# Altium footprint library Footprints.PcbLib: 207 footprints (part 9 of 13)
Each footprint in its own frame and in the unit in brackets; x right, y up, seen from the top. Pads: shape width x height; smd on the part's side, far side on the other; paste and mask are expansions set on the pad; w line width, h text height; cw(c..) or ccw(c..) is an arc to the next point about the centre after c.
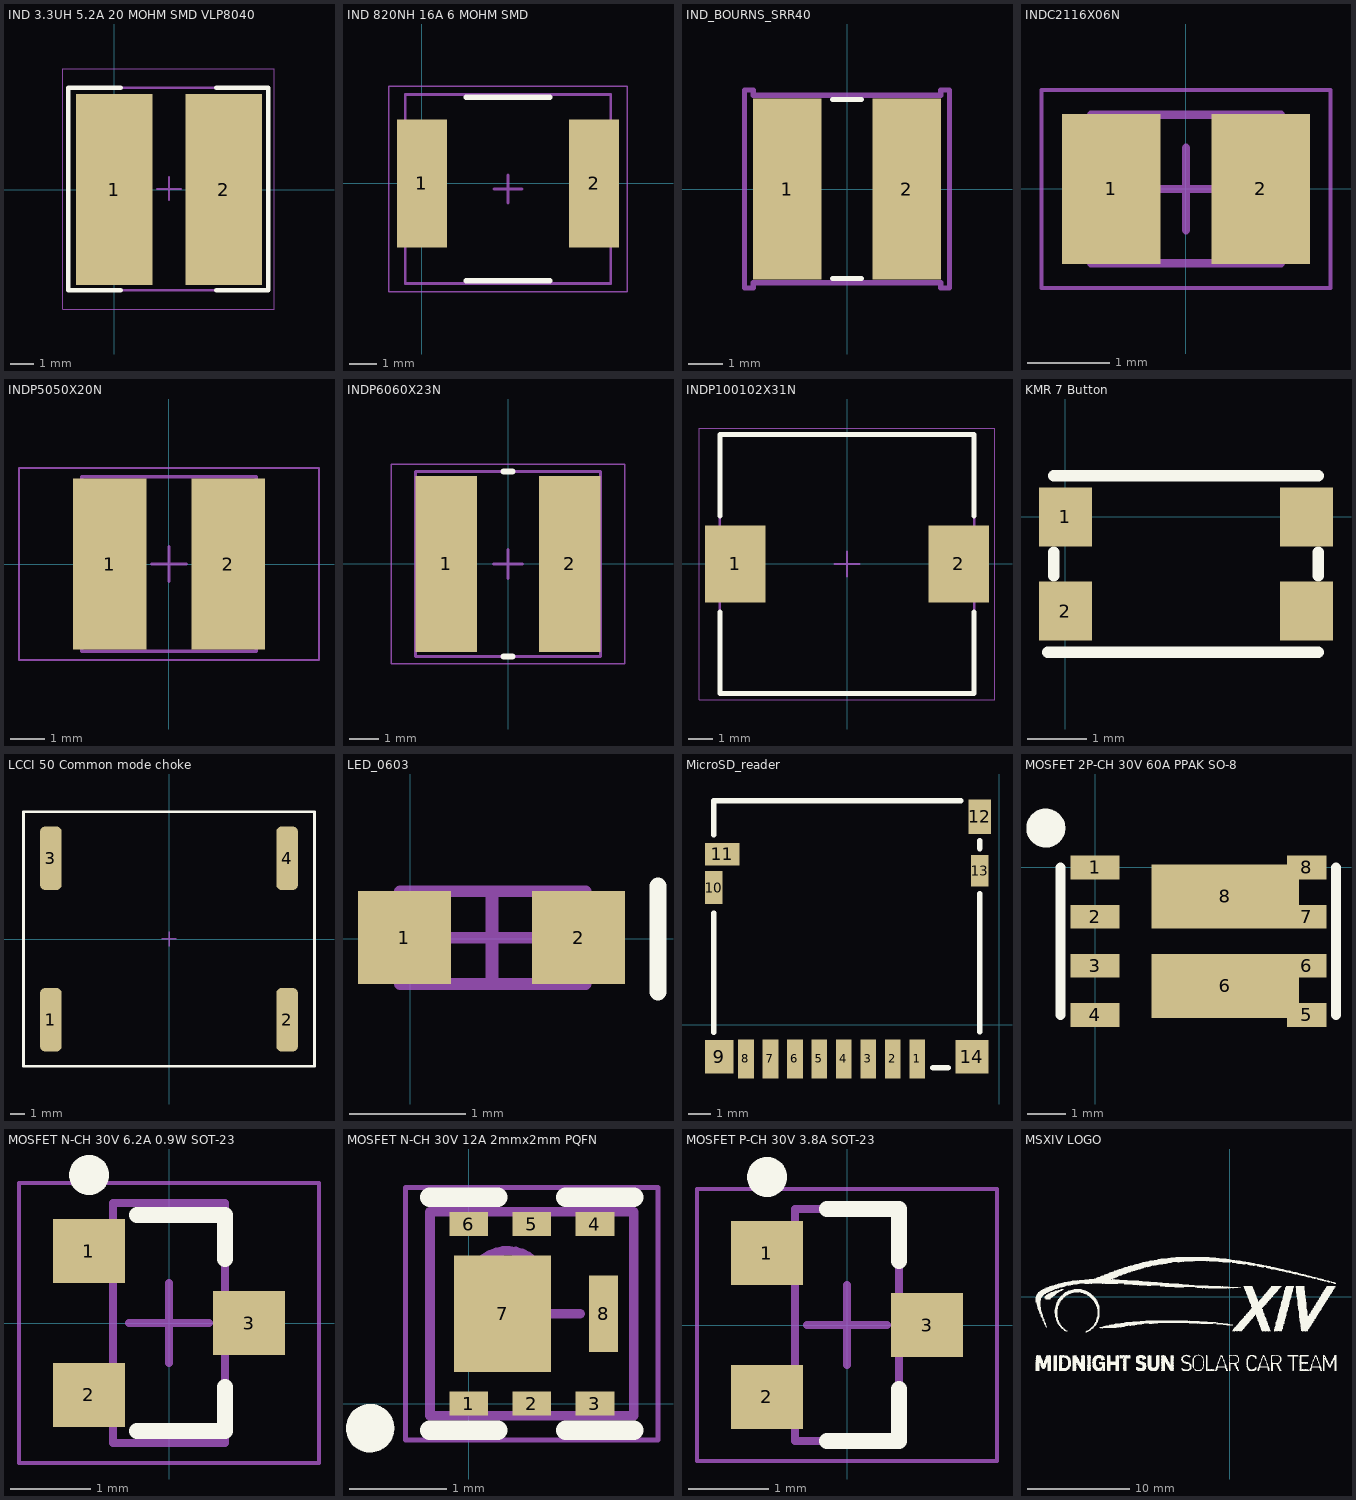
[diagram p8: the footprints below, top view; thin cyan lines are the x and y axes]

## IND 3.3UH 5.2A 20 MOHM SMD VLP8040 [mm] "IND 3.3UH 5.2A 20 MOHM SMD"
height 4
pads (2):
  rect 3.3x8.2 smd: 1(0,0) 2(4.7,0)
Top Overlay:
  lines w0.2: 0.275,-4.325 -1.975,-4.325 -1.975,4.375 0.275,4.375 ; 4.375,-4.325 6.625,-4.325 6.625,4.375 4.375,4.375
Assembly Top:
  lines w0.1: -1.975,-4.325 -1.975,4.375 6.625,4.375 6.625,-4.325 -1.975,-4.325
Courtyard Top:
  lines w0.05: -2.225,-5.15 -2.225,5.2 6.875,5.2 6.875,-5.15 -2.225,-5.15
  lines w0.1: 1.85,0.025 2.85,0.025 ; 2.35,-0.45 2.35,0.525
3D body "IND 3.3UH 5.2A 20 MOHM SMD VLP8040.step": height 4.1, standoff 0, extent -1.625,-4.675 6.975,3.925

## IND 820NH 16A 6 MOHM SMD [mm] "820nH Shielded Molded Inductor 16A 6mOhm Max Nonstandard"
pads (2):
  rect 1.8x4.6 smd: 1(0,0) 2(6.2,0)
Top Overlay:
  lines w0.2: 1.6,-3.51 4.6,-3.51 ; 1.6,3.11 4.6,3.11
Mechanical 13:
  lines w0.1: -0.6,-3.6 -0.6,3.2 6.8,3.2 6.8,-3.6 -0.6,-3.6
Mechanical 15:
  lines w0.05: -1.2,-3.9 -1.2,3.5 7.4,3.5 7.4,-3.9 -1.2,-3.9
  lines w0.1: 2.6,-0.2 3.6,-0.2 ; 3.1,-0.7 3.1,0.3
3D body: height 3, standoff 0, extent 0.9,-3.6 5.3,3.2
3D body: height 3, standoff 0, extent -0.6,-3.6 0.9,3.2
3D body: height 3, standoff 0, extent 5.3,-3.6 6.8,3.2

## IND_BOURNS_SRR40 [mil]
pads (2):
  rect 79x209 smd: 1(-69,0) 2(69,0)
Top Overlay:
  lines w6: -16.4,-103.5 16.4,-103.5 ; -16.4,103.5 16.4,103.5
Mechanical 13:
  circle w0: c-95.5,0 r3
Mechanical 15:
  lines w6: -118.5,-114.5 -108.5,-114.5 -108.5,-108.5 108.5,-108.5 108.5,-114.5 118.5,-114.5 118.5,114.5 108.5,114.5 108.5,108.5 -108.5,108.5 -108.5,114.5 -118.5,114.5 -118.5,-114.5
3D body "IND_BOURNS_SRR4018.stp": height 79, standoff 0, extent -98.5,-104.5 98.5,104.5

## INDC2116X06N [mm] "Chip Inductor, 2-Leads, Body 2.10x1.60mm, IPC Medium Density"
height 0.6
pads (2):
  rect 1.19x1.82 smd: 1(-0.905,0) 2(0.905,0)
Mechanical 13:
  lines w0.1: -1.15,-0.9 -1.15,0.9 1.15,0.9 1.15,-0.9 -1.15,-0.9
Mechanical 15:
  lines w0.05: -1.75,-1.2 -1.75,1.2 1.75,1.2 1.75,-1.2 -1.75,-1.2
  lines w0.1: -0.5,0 0.5,0 ; 0,-0.5 0,0.5
3D body "INDC2116X06N.step": height 0.6, standoff 0, extent -1.15,-0.9 1.15,0.9

## INDP5050X20N [mm] "Precision Wire Wound Inductor, 2-Leads, Body 5.00x5.00mm, IPC Medium Density"
height 2
pads (2):
  rect 2.1x4.9 smd: 1(-1.7,0) 2(1.7,0)
Mechanical 13:
  lines w0.1: -2.5,-2.5 -2.5,2.5 2.5,2.5 2.5,-2.5 -2.5,-2.5
Mechanical 15:
  lines w0.05: -4.3,-2.75 -4.3,2.75 4.3,2.75 4.3,-2.75 -4.3,-2.75
  lines w0.1: -0.5,0 0.5,0 ; 0,-0.5 0,0.5
3D body "INDP5050X20N.step": height 2.1, standoff 0, extent -2.6,-2.5 2.6,2.5

## INDP6060X23N [mm] "Precision Wire Wound Inductor, 2-Leads, Body 6.00x6.00mm, IPC Medium Density"
height 2.29
pads (2):
  rect 2.1x6 smd: 1(-2.1,0) 2(2.1,0)
Top Overlay:
  lines w0.2: -0.15,-3.15 0.15,-3.15 ; -0.15,3.15 0.15,3.15
Mechanical 13:
  lines w0.1: -3.15,-3.15 3.15,-3.15 3.15,3.15 -3.15,3.15 -3.15,-3.15
Mechanical 15:
  lines w0.05: -3.975,-3.4 3.975,-3.4 3.975,3.4 -3.975,3.4 -3.975,-3.4
  lines w0.1: -0.5,0 0.5,0 ; 0,-0.5 0,0.5
3D body "INDP6060X23N.step": height 2.39, standoff 0, extent -3.1,-3 3.1,3

## INDP100102X31N [mm] "Precision Wire Wound Inductor, 2-Leads, Body 10.00x10.20mm, IPC Medium Density"
height 3.1
pads (2):
  rect 2.45x3.1 smd: 1(-4.525,0) 2(4.525,0)
Top Overlay:
  lines w0.2: -5.15,-1.95 -5.15,-5.25 5.15,-5.25 5.15,-1.95 ; -5.15,1.95 -5.15,5.25 5.15,5.25 5.15,1.95
Mechanical 13:
  lines w0.1: -5.15,-5.25 5.15,-5.25 5.15,5.25 -5.15,5.25 -5.15,-5.25
Mechanical 15:
  lines w0.05: -5.975,-5.5 5.975,-5.5 5.975,5.5 -5.975,5.5 -5.975,-5.5
  lines w0.1: -0.5,0 0.5,0 ; 0,-0.5 0,0.5
3D body: height 3.1, standoff 0, extent -5.15,-5.25 5.15,5.25

## KMR 7 Button [mm]
pads (4):
  rect 0.9x1 smd: 1(0,0) 2(0,-1.6) ""(4.1,-1.6) ""(4.1,0)
Top Overlay:
  lines w0.2: -0.3,-2.3 4.3,-2.3 ; -0.2,-1 -0.2,-0.6 ; -0.2,0.7 4.3,0.7 ; 4.3,-1 4.3,-0.6

## LCCI 50 Common mode choke [mil] "5.6A CMC 18mm x20mm x 10mm"
height 51.18
pads (4):
  rrect50% 60x175 smd: 1(-325,-222) 2(325,-222) 3(-325,222) 4(325,222)
Top Overlay:
  lines w7.87: -400,-350 -400,350 400,350 400,-350 -400,-350
Mechanical 13:
  lines w3.94: -400,-350 400,-350 400,350 -400,350 -400,-350
Mechanical 15:
  lines w3.94: -19.68,0 19.68,0 ; 0,-19.68 0,19.69
3D body: height 390, standoff 0, extent -400,-350 400,350

## LED_0603 [mm]
pads (2):
  rect 0.8x0.8 smd: 1(-0.05,0.01) 2(1.45,0.01)
Top Overlay:
  lines w0.15: 2.134,-0.457 2.134,0.453
Mechanical 13:
  rectangle: 1.296,-0.39 1.511,0.41
  lines w0.1: -0.089,-0.39 -0.089,0.41 1.511,0.41 1.511,-0.39 -0.089,-0.39
Mechanical 15:
  lines w0.1: 0.3,0.01 1.1,0.01 ; 0.311,0.01 1.111,0.01 ; 0.7,-0.39 0.7,0.41 ; 0.711,-0.39 0.711,0.41
3D body: height 0.8, standoff 0.3, extent 0.203,-0.295 1.219,0.315
3D body: height 0.3, standoff 0, extent -0.089,-0.39 1.511,0.41

## MicroSD_reader [mm]
pads (14):
  rect 0.7x1.75 smd: 1(-3.686,-1.534) 2(-4.786,-1.534) 3(-5.886,-1.534) 4(-6.986,-1.534) 5(-8.086,-1.534) 6(-9.186,-1.534) 7(-10.286,-1.534) 8(-11.386,-1.534)
  rect 1.3x1.5 smd: 9(-12.586,-1.434)
  rect 0.8x1.5 smd: 10(-12.836,6.166)
  rect 1.55x1 smd: 11(-12.461,7.666)
  rect 1x1.55 smd: 12(-0.886,9.341)
  rect 0.8x1.4 smd: 13(-0.886,6.916)
  rect 1.5x1.5 smd: 14(-1.236,-1.434)
Top Overlay:
  lines w0.254: -12.836,-0.334 -12.836,5.016 ; -12.836,8.541 -12.836,10.066 -5.111,10.066 -1.736,10.066 ; -2.986,-1.934 -2.311,-1.934 ; -0.886,-0.309 -0.886,5.891 ; -0.886,7.916 -0.886,8.266 ; -12.836,5.016 -12.836,5.016 ; -12.836,5.016 -12.836,5.016

## MOSFET 2P-CH 30V 60A PPAK SO-8 [mm] "Mosfet Array 2 P-Channel (Dual) 30V 60A 46W Surface Mount PowerPAK® SO-8 Dual"
height 1.12
pads (10):
  rect 1.27x0.61 smd: 1(0,0) 2(0,-1.27) 3(0,-2.54) 4(0,-3.81)
  rect 1.02x0.61 smd: 5(5.465,-3.81) 6(5.465,-2.54) 7(5.465,-1.27) 8(5.465,0)
  rect 3.81x1.65 smd: 6(3.36,-3.06) 8(3.36,-0.75)
Top Overlay:
  circle w0.5: c-1.27,1.016 r0.254
  lines w0.254: -0.889,-3.81 -0.889,0 ; 6.223,-3.81 6.223,0
3D body: height 1.2, standoff 0, extent -0.762,-4.318 6.096,0.508

## MOSFET N-CH 30V 6.2A 0.9W SOT-23 [mm] "SOT23, 3-Leads, Body 2.90x2.40mm, Pitch 0.90mm, IPC Medium Density"
height 1.1
pads (3):
  rect 0.9x0.8 smd: 1(-1,0.9) 2(-1,-0.9) 3(1,0)
Top Overlay:
  circle w0.25: c-1,1.85 r0.125
  lines w0.2: -0.4,-1.35 0.7,-1.35 0.7,-0.8 ; -0.4,1.35 0.7,1.35 0.7,0.8
Mechanical 13:
  lines w0.1: -0.7,-1.5 0.7,-1.5 0.7,1.5 -0.7,1.5 -0.7,-1.5
Mechanical 15:
  lines w0.05: -1.875,-1.75 1.875,-1.75 1.875,1.75 -1.875,1.75 -1.875,-1.75
  lines w0.1: -0.5,0 0.5,0 ; 0,-0.5 0,0.5
3D body "MOSFET N-CH 30V.step": height 1.1, standoff 0, extent -1.25,-1.5 1.25,1.5

## MOSFET N-CH 30V 12A 2mmx2mm PQFN [mm] "PQFN, 6-Leads, Body 2.00x2.00mm, Pitch 0.65mm/0.50mm, Thermal Pad 1.00x1.20mm, IPC Medium Density"
height 1
pads (8):
  rect 0.4x0.25 smd: 1(0,0) 2(0.65,0) 3(1.3,0) 4(1.3,1.85) 5(0.65,1.85) 6(0,1.85)
  rect 1x1.2 smd: 7(0.35,0.925)
  rect 0.3x0.79 smd: 8(1.39,0.925)
Top Overlay:
  circle w0.25: c-1.016,-0.254 r0.125
  lines w0.2: -0.4,-0.275 0.3,-0.275 ; -0.4,2.125 0.3,2.125 ; 1,-0.275 1.7,-0.275 ; 1,2.125 1.7,2.125
Mechanical 13:
  circle w0.1: c0.4,1.175 r0.4
  lines w0.1: -0.4,-0.125 1.7,-0.125 1.7,1.975 -0.4,1.975 -0.4,-0.125
Mechanical 15:
  lines w0.05: -0.65,-0.375 1.95,-0.375 1.95,2.225 -0.65,2.225 -0.65,-0.375
  lines w0.1: 0.15,0.925 1.15,0.925 ; 0.65,0.425 0.65,1.425
3D body "MOSFET N-CH 30V 12A 2mmx2mm PQFN.step": height 1, standoff 0, extent -0.4,-0.125 1.7,1.975

## MOSFET P-CH 30V 3.8A SOT-23 [mm] "SOT23, 3-Leads, Body 2.85x2.40mm, Pitch 0.90mm, IPC Medium Density"
height 1.1
pads (3):
  rect 0.9x0.8 smd: 1(-1,0.9) 2(-1,-0.9) 3(1,0)
Top Overlay:
  circle w0.25: c-1,1.85 r0.125
  lines w0.2: -0.25,-1.45 0.65,-1.45 0.65,-0.8 ; -0.25,1.45 0.65,1.45 0.65,0.8
Mechanical 13:
  lines w0.1: -0.65,-1.45 0.65,-1.45 0.65,1.45 -0.65,1.45 -0.65,-1.45
Mechanical 15:
  lines w0.05: -1.875,-1.7 1.875,-1.7 1.875,1.7 -1.875,1.7 -1.875,-1.7
  lines w0.1: -0.5,0 0.5,0 ; 0,-0.5 0,0.5
3D body "MOSFET P-CH 30V 3.8A SOT-23.step": height 1.1, standoff 0, extent -1.25,-1.45 1.25,1.45

## MSXIV LOGO [mm]
Top Overlay:
  drawing of 32 lines, arcs and shapes, not listed